# Altium footprint library Selex_PCBLib.PcbLib: 388 footprints (part 7 of 25)
Each footprint in its own frame and in the unit in brackets; x right, y up, seen from the top. Pads: shape width x height; smd on the part's side, far side on the other; paste and mask are expansions set on the pad; w line width, h text height; cw(c..) or ccw(c..) is an arc to the next point about the centre after c.
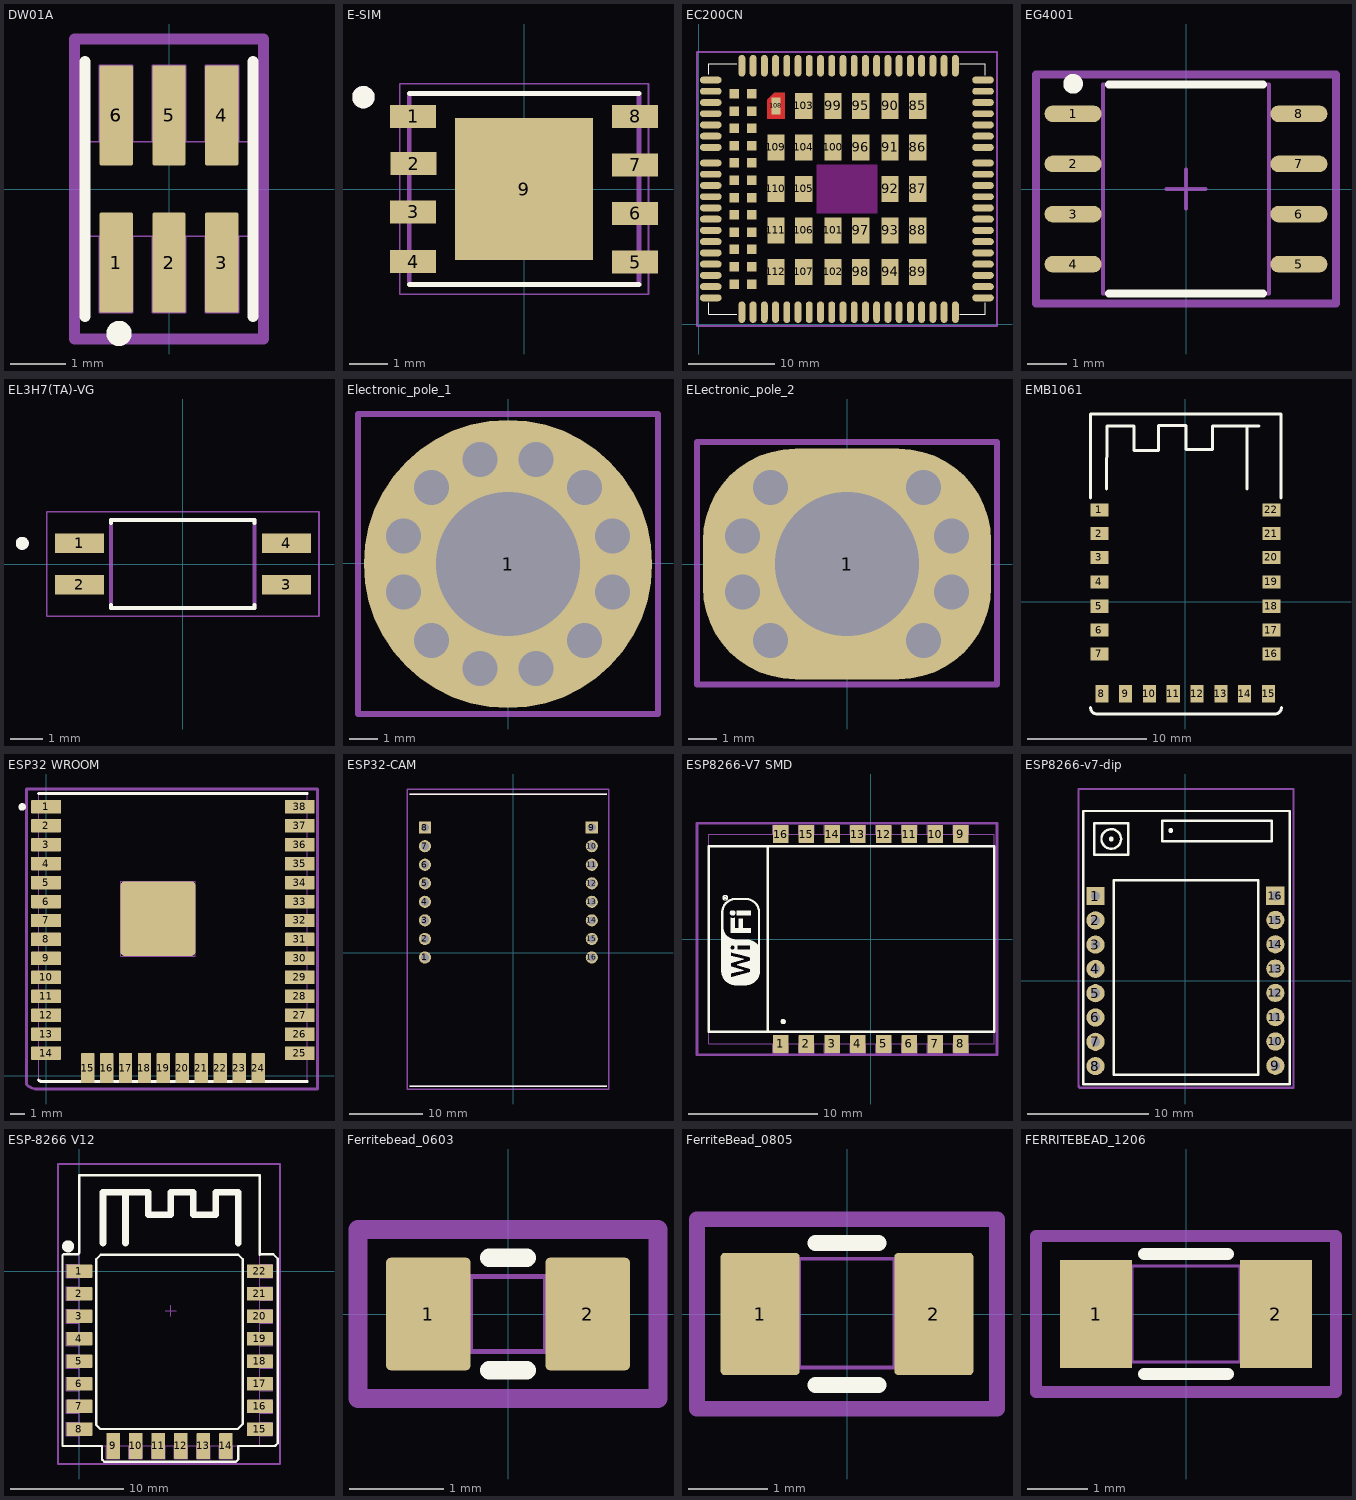
[diagram p6: the footprints below, top view; thin cyan lines are the x and y axes]

## DW01A [mm] "SOT23-6, SMD."
height 1.25
pads (7):
  rrect10% 0.6x1.8 smd mask+0.05: 1(-0.95,-1.325) 2(0,-1.325) 3(0.95,-1.325) 4(0.95,1.325) 5(0,1.325) 6(-0.95,1.325) 6(-0.95,1.325)
Top Overlay:
  circle w0.254: c-0.9,-2.6 r0.1
  lines w0.2: -1.51,-2.29 -1.51,-0.2 -1.51,0.2 -1.51,2.29 ; 1.51,-2.29 1.51,2.29 ; 1.51,-0.2 1.51,0.2
Mechanical 1:
  lines w0.03: -1.25,-2.225 -0.65,-2.225 ; -1.25,-2.225 -1.25,-0.85 ; -1.25,-2.225 -1.25,-0.85 ; -1.25,-2.225 -0.65,-2.225 ; -1.25,-0.85 -0.65,-0.85 ; -0.65,-2.225 -0.65,-0.85 ; -0.65,-2.225 -0.65,-0.85 ; 0.65,2.225 0.65,0.85 1.25,0.85 ; 0.65,2.225 1.25,2.225 ; 0.65,2.225 1.25,2.225 ; 1.25,0.85 1.25,2.225 ; 1.25,0.85 1.25,2.225 ; -1.51,-0.85 1.51,-0.85 1.51,0.85 -1.51,0.85 -1.51,-0.85 ; -1.25,0.85 -0.65,0.85 -0.65,2.225 -1.25,2.225 -1.25,0.85 ; -0.3,-2.225 -0.3,-0.85 0.3,-0.85 0.3,-2.225 -0.3,-2.225 ; -0.3,0.85 0.3,0.85 0.3,2.225 -0.3,2.225 -0.3,0.85 ; 0.65,-2.225 0.65,-0.85 1.25,-0.85 1.25,-2.225 0.65,-2.225
Mechanical 7:
  lines w0.2: -1.7,-2.7 -1.7,-0.3 -1.7,2.7 1.7,2.7 1.7,-2.7 -1.7,-2.7
3D body "User Library-SOT23-6-2.step": height 1.45, standoff 0, extent -1.45,-1.4 1.45,1.4

## E-SIM [mm]
pads (9):
  rect 1.2x0.6 smd: 1(-2.9,1.9) 2(-2.886,0.663) 3(-2.9,-0.6) 4(-2.9,-1.9) 5(2.9,-1.91) 6(2.9,-0.64) 7(2.9,0.63) 8(2.9,1.9)
  rect 3.6x3.7 smd paste-3: 9(0,0)
Top Overlay:
  circle w0.3: c-4.2,2.4 r0.141
  lines w0.127: -3,-2.5 3,-2.5 ; -3,2.5 3,2.5
Top Paste:
  region: 1.5,-1.45 0.18,-1.45 0.18,-0.18 1.5,-0.18
  region: -0.18,-1.45 -1.5,-1.45 -1.5,-0.18 -0.18,-0.18
  region: 1.5,0.18 0.18,0.18 0.18,1.45 1.5,1.45
  region: -0.18,0.18 -1.5,0.18 -1.5,1.45 -0.18,1.45
Mechanical 13:
  circle w0.3: c-4.2,2.4 r0.141
  lines w0.127: -3,-2.5 -3,2.5 3,2.5 3,-2.5 -3,-2.5
Mechanical 15:
  lines w0.05: -3.25,-2.75 -3.25,2.75 3.25,2.75 3.25,-2.75 -3.25,-2.75
3D body "SIM-ST-MFF2--3DModel-STEP-56544.STEP": height 0, standoff -0.82, extent -3,-2.5 3,2.5

## EC200CN [mm]
pads (132):
  oval 2.5x0.8 smd mask+0.05: 1(1.385,28.258) 2(1.385,26.958) 3(1.385,25.658) 4(1.385,24.358) 5(1.385,23.058) 6(1.385,21.758) 7(1.385,20.458) 8(1.385,16.058) 9(1.385,14.758) 10(1.385,13.458) 11(1.385,12.158) 12(1.385,10.858) 13(1.385,9.558) 14(1.385,8.258) 15(1.385,6.958) 16(1.385,5.658) 17(1.385,4.358) 18(1.385,3.058) 37(32.885,3.058) 38(32.885,4.358) 39(32.885,5.658) 40(32.885,6.958) 41(32.885,8.258) 42(32.885,9.558) 43(32.885,10.858) 44(32.885,12.158) 45(32.885,13.458) 46(32.885,14.758) 47(32.885,16.058) 48(32.885,20.458) 49(32.885,21.758) 50(32.885,23.058) 51(32.885,24.358) 52(32.885,25.658) 53(32.885,26.958) 54(32.885,28.258) 141(1.385,18.658) 142(1.385,17.358) 143(32.885,17.358) 144(32.885,18.658)
  oval 0.8x2.5 smd mask+0.05: 19(7.585,1.408) 20(8.885,1.408) 21(10.185,1.408) 22(11.485,1.408) 23(12.785,1.408) 24(14.085,1.408) 25(15.385,1.408) 26(16.685,1.408) 27(17.985,1.408) 28(19.285,1.408) 29(20.585,1.408) 30(21.885,1.408) 31(23.185,1.408) 32(24.485,1.408) 33(25.785,1.408) 34(27.085,1.408) 35(28.385,1.408) 36(29.685,1.408) 55(29.685,29.908) 56(28.385,29.908) 57(27.085,29.908) 58(25.785,29.908) 59(24.485,29.908) 60(23.185,29.908) 61(21.885,29.908) 62(20.585,29.908) 63(19.285,29.908) 64(17.985,29.908) 65(16.685,29.908) 66(15.385,29.908) 67(14.085,29.908) 68(12.785,29.908) 69(11.485,29.908) 70(10.185,29.908) 71(8.885,29.908) 72(7.585,29.908) 113(6.285,29.908) 114(4.985,29.908) 115(6.285,1.408) 116(4.985,1.408)
  rect 2x3 smd mask+0.05: 85(25.335,25.258) 86(25.335,20.458) 87(25.335,15.658) 88(25.335,10.858) 89(25.335,6.058) 90(22.135,25.258) 91(22.135,20.458) 92(22.135,15.658) 93(22.135,10.858) 94(22.135,6.058) 95(18.735,25.258) 96(18.735,20.458) 97(18.735,10.858) 98(18.735,6.058) 99(15.535,25.258) 100(15.535,20.458) 101(15.535,10.858) 102(15.535,6.058) 103(12.135,25.258) 104(12.135,20.458) 105(12.135,15.658) 106(12.135,10.858) 107(12.135,6.058) 109(8.935,20.458) 110(8.935,15.658) 111(8.935,10.858) 112(8.935,6.058)
  rect 1x2 smd mask+0.05: 108(8.935,25.258)
  rect 1.1x1.1 smd mask+0.05: 117(6.135,26.658) 118(6.135,24.658) 119(6.135,22.658) 120(6.135,20.658) 121(6.135,18.658) 122(6.135,16.658) 123(6.135,14.658) 124(6.135,12.658) 125(6.135,10.658) 126(6.135,8.658) 127(6.135,6.658) 128(6.135,4.658) 129(4.135,26.658) 130(4.135,24.658) 131(4.135,22.658) 132(4.135,20.658) 133(4.135,18.658) 134(4.135,16.658) 135(4.135,14.658) 136(4.135,12.658) 137(4.135,10.658) 138(4.135,8.658) 139(4.135,6.658) 140(4.135,4.658)
Top Layer:
  region: 7.935,25.958 8.735,26.758 9.935,26.758 9.935,23.758 7.935,23.758
Top Overlay:
  lines w0.102: 1.135,2.5 1.135,1.158 4.4,1.158 ; 1.135,28.9 1.135,30.158 ; 1.135,29.708 1.135,30.158 ; 1.585,30.158 1.135,30.158 ; 4.4,30.158 1.135,30.158 ; 30.2,1.158 33.135,1.158 33.135,2.5 ; 30.2,30.158 33.135,30.158 33.135,28.8
Top Paste:
  region: 7.935,25.958 8.735,26.758 9.935,26.758 9.935,23.758 7.935,23.758
Top Solder:
  region: 7.885,23.708 9.985,23.708 9.985,26.808 8.685,26.808 7.885,26.008
Keep-Out Layer:
  region: 20.635,18.458 13.635,18.458 13.635,12.858 20.635,12.858
Mechanical 15:
  lines w0.2: -0.2,-0.2 -0.2,31.5 34.5,31.5 34.5,-0.2 -0.2,-0.2
3D body "Quectel_EC200S-CN_3D_Dimensions.stp": height 2.4, standoff 0, extent 1.19,1.1 33.19,30.1

## EG4001 [mm] "TSOP, 8-Leads, Body 5.15x4.05mm, Pitch 1.27mm, IPC Medium Density"
height 0.2
pads (8):
  oval 1.45x0.42 smd: 1(-2.86,1.905) 2(-2.86,0.635) 3(-2.86,-0.635) 4(-2.86,-1.905) 5(2.86,-1.905) 6(2.86,-0.635) 7(2.86,0.635) 8(2.86,1.905)
Top Overlay:
  circle w0.25: c-2.86,2.665 r0.125
  lines w0.2: -1.95,-2.65 1.95,-2.65 ; -1.95,2.65 1.95,2.65
Mechanical 13:
  lines w0.1: -2.1,-2.65 2.1,-2.65 2.1,2.65 -2.1,2.65 -2.1,-2.65
Mechanical 15:
  lines w0.1: -0.5,0 0.5,0 ; 0,-0.5 0,0.5
  lines w0.2: -3.8,-2.9 3.8,-2.9 3.8,2.9 -3.8,2.9 -3.8,-2.9
3D body: height 0.2, standoff 0.15, extent -2.1,-2.65 2.1,2.65

## EL3H7(TA)-VG [mm]
pads (4):
  rect 1.5x0.6 smd: 1(-3.175,0.635) 2(-3.175,-0.635) 3(3.175,-0.635) 4(3.175,0.635)
Top Overlay:
  circle w0.2: c-4.925,0.635 r0.1
  lines w0.127: -2.2,-1.255 -2.2,-1.35 2.2,-1.35 2.2,-1.255 ; -2.2,1.255 -2.2,1.35 2.2,1.35 2.2,1.255
Mechanical 13:
  circle w0.2: c-4.925,0.635 r0.1
  lines w0.127: -2.2,-1.35 -2.2,1.35 2.2,1.35 2.2,-1.35 -2.2,-1.35
Mechanical 15:
  lines w0.05: -4.175,-1.6 -4.175,1.6 4.175,1.6 4.175,-1.6 -4.175,-1.6
3D body "SOIC__TA_-VG.step": height 2.01, standoff 0, extent -3.645,-1.448 3.645,1.448

## Electronic_pole_1 [mm]
pads (1):
  round 10 hole 5: 1(0,-0.025)
via -0.97,3.597 diameter 1.4 hole 1.2
via -2.652,2.626 diameter 1.4 hole 1.2
via -3.622,0.945 diameter 1.4 hole 1.2
via -3.622,-0.996 diameter 1.4 hole 1.2
via -2.652,-2.677 diameter 1.4 hole 1.2
via -0.97,-3.648 diameter 1.4 hole 1.2
via 0.97,-3.648 diameter 1.4 hole 1.2
via 2.652,-2.677 diameter 1.4 hole 1.2
via 3.622,-0.996 diameter 1.4 hole 1.2
via 3.622,0.945 diameter 1.4 hole 1.2
via 2.652,2.626 diameter 1.4 hole 1.2
via 0.97,3.597 diameter 1.4 hole 1.2
Top Overlay:
  circle w0.1: c0,-0.025 r3.75
Mechanical 15:
  lines w0.2: -5.2,-5.225 -5.2,5.175 0,5.175 5.2,5.175 5.2,-5.225 -5.2,-5.225
3D body "cocdongbe.x_t": height 28, standoff 0, extent -3.475,-3.505 3.525,3.495

## ELectronic_pole_2 [mm]
pads (1):
  rrect80% 10x8 hole 5: 1(0,0)
via -3.622,0.97 diameter 1.4 hole 1.2
via -2.652,2.652 diameter 1.4 hole 1.2
via -3.622,-0.97 diameter 1.4 hole 1.2
via -2.652,-2.652 diameter 1.4 hole 1.2
via 2.652,-2.652 diameter 1.4 hole 1.2
via 3.622,-0.97 diameter 1.4 hole 1.2
via 3.622,0.97 diameter 1.4 hole 1.2
via 2.652,2.652 diameter 1.4 hole 1.2
Top Overlay:
  circle w0.1: c0,0 r3.75
Mechanical 15:
  lines w0.2: -5.2,-4.175 5.2,-4.175 5.2,4.225 -0.975,4.225 -5.2,4.225 -5.2,-4.175
3D body "cocdongbe.x_t": height 28, standoff 0, extent -3.475,-3.48 3.525,3.52

## EMB1061 [mm]
pads (22):
  rect 1.5x1.1 smd: 1(-7.225,7.725) 2(-7.225,5.725) 3(-7.225,3.725) 4(-7.225,1.675) 5(-7.225,-0.375) 6(-7.225,-2.375) 7(-7.225,-4.375) 16(7.225,-4.375) 17(7.225,-2.375) 18(7.225,-0.375) 19(7.225,1.675) 20(7.225,3.725) 21(7.225,5.725) 22(7.225,7.725)
  rect 1.1x1.5 smd: 8(-7.025,-7.725) 9(-5.025,-7.725) 10(-3.025,-7.725) 11(-1.025,-7.725) 12(0.975,-7.725) 13(2.975,-7.725) 14(4.975,-7.725) 15(6.975,-7.725)
Top Overlay:
  lines w0.254: -7.975,-8.875 ccw(c-7.425,-8.875) -7.425,-9.425 7.503,-9.425 ccw(c7.503,-8.864) 8.064,-8.864 ; -7.975,8.725 -7.975,15.775 8.025,15.775 8.025,8.725 ; -6.621,9.475 -6.575,14.775 -4.325,14.775 -4.325,12.725 -2.275,12.725 -2.275,14.825 0.025,14.825 0.025,12.775 2.275,12.775 2.275,14.775 5.175,14.775 ; 5.175,9.475 5.175,14.775 ; 6.175,14.775 5.175,14.775

## ESP32 WROOM [mm] "ESP 32 WROOM"
height 3.2
pads (39):
  rrect10% 2x0.9 smd mask+0.05: 1(0,18.01) 2(0,16.74) 3(0,15.47) 4(0,14.2) 5(0,12.93) 6(0,11.66) 7(0,10.39) 8(0,9.12) 9(0,7.85) 10(0,6.58) 11(0,5.31) 12(0,4.04) 13(0,2.77) 14(0,1.5) 25(17,1.5) 26(17,2.77) 27(17,4.04) 28(17,5.31) 29(17,6.58) 30(17,7.85) 31(17,9.12) 32(17,10.39) 33(17,11.66) 34(17,12.93) 35(17,14.2) 36(17,15.47) 37(17,16.74) 38(17,18.01)
  rrect10% 0.9x2 smd mask+0.05: 15(2.785,0.5) 16(4.055,0.5) 17(5.325,0.5) 18(6.595,0.5) 19(7.865,0.5) 20(9.135,0.5) 21(10.405,0.5) 22(11.675,0.5) 23(12.945,0.5) 24(14.215,0.5)
  rrect10% 5x5 smd mask+0.05: ""(7.5,10.51)
Top Overlay:
  circle w0.25: c-1.6,18 r0.125
  lines w0.2: -0.5,-0.3 ccw(c-0.259,-0.059) -0.259,-0.4 17.5,-0.4 ; -0.5,18.9 17.5,18.9
Mechanical 1:
  lines w0.05: -0.5,-0.345 -0.5,18.855 17.5,18.855 17.5,-0.345 -0.5,-0.345 ; 5,8.01 5,13.01 10,13.01 10,8.01 5,8.01
Mechanical 7:
  lines w0.2: -1.3,-0.6 ccw(c-0.576,0.124) -0.576,-0.9 18.2,-0.9 18.2,19.2 -1.3,19.2 -1.3,-0.6

## ESP32-CAM [mm]
pads (16):
  round 1.665 hole 1.11: 1(-12.081,-0.677) 2(-12.081,1.863) 3(-12.081,4.403) 4(-12.081,6.943) 5(-12.081,9.483) 6(-12.081,12.023) 7(-12.081,14.563) 10(10.779,14.563) 11(10.779,12.023) 12(10.779,9.483) 13(10.779,6.943) 14(10.779,4.403) 15(10.779,1.863) 16(10.779,-0.677)
  rect 1.665x1.665 hole 1.11: 8(-12.081,17.103) 9(10.779,17.103)
Top Overlay:
  lines w0.2: -14.151,-18.317 12.849,-18.317 ; -14.151,21.683 12.849,21.683
Mechanical 13:
  lines w0.2: -14.151,-18.317 12.849,-18.317 ; -14.151,21.683 12.849,21.683
Mechanical 15:
  lines w0.2: -14.5,-18.7 -14.5,22.4 13.1,22.4 13.1,-18.7 -14.5,-18.7
3D body "ESP3-CAM v5 - black pcb.step": height 4.01, standoff -14.07, extent -14.33,-18.26 12.67,22.24

## ESP8266-V7 SMD [mm]
pads (16):
  rrect10% 1.2x1.4 smd mask+0.05: 1(-7,-8.15) 2(-5,-8.15) 3(-3,-8.15) 4(-1,-8.15) 5(1,-8.15) 6(3,-8.15) 7(5,-8.15) 8(7,-8.15) 9(7,8.15) 10(5,8.15) 11(3,8.15) 12(1,8.15) 13(-1,8.15) 14(-3,8.15) 15(-5,8.15) 16(-7,8.15)
Top Overlay:
  drawing of 1266 lines, arcs and shapes, not listed
Mechanical 1:
  lines w0.05: -12.6,8.15 -12.6,8.15 ; -12.6,8.15 9.6,8.15 ; -12.6,8.15 -12.6,-8.15 9.6,-8.15 9.6,8.15 ; -7.6,-8.85 -6.4,-8.85 ; -7.6,-8.85 -7.6,-8.15 ; -7.6,-8.85 -7.6,-8.15 ; -7.6,-8.85 -6.4,-8.85 ; -7.6,-8.15 -6.4,-8.15 ; -6.4,-8.85 -6.4,-8.15 ; -6.4,-8.85 -6.4,-8.15 ; 6.4,8.15 6.4,8.85 ; 6.4,8.15 6.4,8.85 ; 6.4,8.15 7.6,8.15 ; 6.4,8.85 7.6,8.85 ; 6.4,8.85 7.6,8.85 ; 7.6,8.15 7.6,8.85 ; 7.6,8.15 7.6,8.85 ; 7.6,8.15 9.6,8.15 ; -7.6,8.15 -6.4,8.15 -6.4,8.85 -7.6,8.85 -7.6,8.15 ; -5.6,-8.85 -5.6,-8.15 -4.4,-8.15 -4.4,-8.85 -5.6,-8.85 ; -5.6,8.15 -4.4,8.15 -4.4,8.85 -5.6,8.85 -5.6,8.15 ; -3.6,-8.85 -3.6,-8.15 -2.4,-8.15 -2.4,-8.85 -3.6,-8.85 ; -3.6,8.15 -2.4,8.15 -2.4,8.85 -3.6,8.85 -3.6,8.15 ; -1.6,-8.85 -1.6,-8.15 -0.4,-8.15 -0.4,-8.85 -1.6,-8.85 ; -1.6,8.15 -0.4,8.15 -0.4,8.85 -1.6,8.85 -1.6,8.15 ; 0.4,-8.85 0.4,-8.15 1.6,-8.15 1.6,-8.85 0.4,-8.85 ; 0.4,8.15 1.6,8.15 1.6,8.85 0.4,8.85 0.4,8.15 ; 2.4,-8.85 2.4,-8.15 3.6,-8.15 3.6,-8.85 2.4,-8.85 ; 2.4,8.15 3.6,8.15 3.6,8.85 2.4,8.85 2.4,8.15 ; 4.4,-8.85 4.4,-8.15 5.6,-8.15 5.6,-8.85 4.4,-8.85 ; 4.4,8.15 5.6,8.15 5.6,8.85 4.4,8.85 4.4,8.15 ; 6.4,-8.85 6.4,-8.15 7.6,-8.15 7.6,-8.85 6.4,-8.85
  text "16" at -7.5,5.9 h0.8
  text "9" at 6.8,6 h0.8
  text "8" at 6.8,-6.8 h0.8
  text "1" at -7.2,-6.8 h0.8
Mechanical 7:
  lines w0.2: -6.9,9 9.8,9 9.8,-9 -13.5,-9 -13.5,9 -6.7,9
3D body "User Library-ESP07-1.step": height 3.5, standoff -0.01, extent -13.313,-8.181 8.687,7.819

## ESP8266-v7-dip [mm] "dip,though"
pads (16):
  rect 1.5x1.5 hole 0.75: 1(-7.404,6.987) 16(7.404,7.013)
  round 1.5 hole 0.75: 2(-7.404,4.987) 3(-7.404,2.987) 4(-7.404,0.987) 5(-7.404,-1.013) 6(-7.404,-3.013) 7(-7.404,-5.013) 8(-7.404,-7.013) 9(7.404,-6.987) 10(7.404,-4.987) 11(7.404,-2.987) 12(7.404,-0.987) 13(7.404,1.013) 14(7.404,3.013) 15(7.404,5.013)
Top Overlay:
  circle w0.2: c-6.104,11.687 r0.806
  circle w0.2: c-6.104,11.687 r0.1
  circle w0.2: c-1.204,12.387 r0.1
  lines w0.2: -8.404,-8.513 -8.404,13.987 8.596,13.987 8.596,-8.513 -8.404,-8.513 ; -7.504,10.387 -7.504,12.987 -4.704,12.987 -4.704,10.387 -7.504,10.387 ; -5.904,-7.713 5.996,-7.713 5.996,8.287 -5.904,8.287 -5.904,-7.713 ; -1.904,11.487 -1.904,13.187 7.096,13.187 7.096,11.487 -1.904,11.487
Mechanical 7:
  lines w0.2: -8.8,-8.559 ccw(c-8.459,-8.559) -8.7,-8.8 8.9,-8.8 8.9,15.8 -8.8,15.8 -8.8,2.5 -8.8,-8.559
3D body "User Library-PBS2-8.STEP": height 4.5, standoff -2.95, extent -8.337,-7.998 -6.337,8.002
3D body "User Library-PBS2-8.STEP": height 4.5, standoff -2.95, extent 6.42,-8.099 8.42,7.901
3D body "User Library-ESP_12_E.STEP": height 6.75, standoff 4.54, extent -8.014,-8.366 7.986,15.635

## ESP-8266 V12 [mm]
pads (22):
  rrect10% 2.3x1.2 smd mask+0.05: 1(0,0) 2(0,-2) 3(0,-4) 4(0,-6) 5(0,-8) 6(0,-10) 7(0,-12) 8(0,-14) 15(16,-14) 16(16,-12) 17(16,-10) 18(16,-8) 19(16,-6) 20(16,-4) 21(16,-2) 22(16,0)
  rrect10% 1.2x2.3 smd mask+0.05: 9(3,-15.5) 10(5,-15.5) 11(7,-15.5) 12(9,-15.5) 13(11,-15.5) 14(13,-15.5)
Top Overlay:
  circle w0.5: c-1,2.2 r0.283
  lines w0.2: 2,1.45 1.9,1.45 ; 1.9,1.45 14.1,1.45 14.5,1.05 14.5,-13.55 14.05,-14 1.85,-14 1.5,-13.65 1.5,1.05 1.9,1.45 ; -1.5,-15.5 0,-15.5 2,-15.5 2,-16.7 2.2,-16.9 13.9,-16.9 14.1,-16.7 14.1,-15.5 16,-15.5 17.35,-15.5 17.6,-15.25 17.6,-15.2 17.6,1.1 17.2,1.5 16.05,1.5 16,1.45 16,8.5 0,8.5 0,1.6 -0.1,1.5 -1.4,1.5 -1.5,1.4 -1.5,0.7 -1.5,-15.5
  lines w0.6: 2.1,2.5 2.1,7 6.1,7 6.1,5 8.1,5 8.1,7 10.1,7 10.1,5 12.1,5 12.1,7 14.1,7 14.1,2.5 ; 4.1,2.5 4.1,7
Mechanical 1:
  lines w0.05: 16,-14 16,-15.5 ; 16,-15.5 16,8.5 0,8.5 0,-14 0,-15.5 16,-15.5 ; -1.15,-14.6 -1.15,-13.4 0,-13.4 0,-14.6 -1.15,-14.6 ; -1.15,-12.6 -1.15,-11.4 0,-11.4 0,-12.6 -1.15,-12.6 ; -1.15,-10.6 -1.15,-9.4 0,-9.4 0,-10.6 -1.15,-10.6 ; -1.15,-8.6 -1.15,-7.4 0,-7.4 0,-8.6 -1.15,-8.6 ; -1.15,-6.6 -1.15,-5.4 0,-5.4 0,-6.6 -1.15,-6.6 ; -1.15,-4.6 -1.15,-3.4 0,-3.4 0,-4.6 -1.15,-4.6 ; -1.15,-2.6 -1.15,-1.4 0,-1.4 0,-2.6 -1.15,-2.6 ; -1.15,-0.6 0,-0.6 0,0.6 -1.15,0.6 -1.15,-0.6 ; 2.4,-16.65 3.6,-16.65 3.6,-15.5 2.4,-15.5 2.4,-16.65 ; 4.4,-16.65 5.6,-16.65 5.6,-15.5 4.4,-15.5 4.4,-16.65 ; 6.4,-16.65 7.6,-16.65 7.6,-15.5 6.4,-15.5 6.4,-16.65 ; 8.4,-16.65 9.6,-16.65 9.6,-15.5 8.4,-15.5 8.4,-16.65 ; 10.4,-16.65 11.6,-16.65 11.6,-15.5 10.4,-15.5 10.4,-16.65 ; 12.4,-16.65 13.6,-16.65 13.6,-15.5 12.4,-15.5 12.4,-16.65 ; 16,-14.6 16,-13.4 17.15,-13.4 17.15,-14.6 16,-14.6 ; 16,-12.6 16,-11.4 17.15,-11.4 17.15,-12.6 16,-12.6 ; 16,-10.6 16,-9.4 17.15,-9.4 17.15,-10.6 16,-10.6 ; 16,-8.6 16,-7.4 17.15,-7.4 17.15,-8.6 16,-8.6 ; 16,-6.6 16,-5.4 17.15,-5.4 17.15,-6.6 16,-6.6 ; 16,-4.6 16,-3.4 17.15,-3.4 17.15,-4.6 16,-4.6 ; 16,-2.6 16,-1.4 17.15,-1.4 17.15,-2.6 16,-2.6 ; 16,-0.6 16,0.6 17.15,0.6 17.15,-0.6 16,-0.6
Mechanical 15:
  lines w0.1: 7.6,-3.502 8.6,-3.502 ; 8.1,-4.002 8.1,-3.002
  lines w0.2: -1.9,-17.1 -1.9,9.5 17.8,9.5 17.8,-17.1 -1.9,-17.1
3D body "User Library-ESP8266-12E.STEP": height 2.6, standoff -0.4, extent 0,-15.45 16,8.93

## Ferritebead_0603 [mm]
pads (2):
  rrect10% 0.9x1.2 smd mask+0.1: 1(-0.85,0)
  rrect10% 0.9x1.2 smd: 2(0.85,0)
Top Overlay:
  lines w0.2: -0.2,-0.6 0.2,-0.6 ; -0.2,0.6 0.2,0.6
Mechanical 1:
  lines w0.05: -0.4,-0.4 -0.4,0.4 ; 0.4,-0.4 0.4,0.4 ; -0.8,-0.4 -0.8,0.4 0.8,0.4 0.8,-0.4 -0.8,-0.4
Mechanical 15:
  lines w0.2: -1.6,-0.9 -1.6,0.9 1.6,0.9 1.6,-0.9 -1.6,-0.9
3D body "L0603C22NJRMST.STEP": height 0.9, standoff 0.1, extent -0.8,-0.55 0.8,0.4

## FerriteBead_0805 [mm]
pads (2):
  rrect10% 1x1.55 smd mask+0.1: 1(-1.1,0) 2(1.1,0)
Top Overlay:
  lines w0.2: -0.4,-0.9 0.4,-0.9 ; -0.4,0.9 0.4,0.9
Mechanical 1:
  lines w0.05: -0.61,-0.675 -0.61,0.675 ; 0.6,-0.66 0.6,0.675 ; -1.1,-0.675 -1.1,0.7 1.1,0.7 1.1,-0.675 -1.1,-0.675
Mechanical 15:
  lines w0.2: -1.9,-1.2 -1.9,1.2 1.9,1.2 1.9,-1.2 -1.9,-1.2
3D body "CAP0805.step": height 0.73, standoff -0.03, extent -1,-0.655 1,0.655

## FERRITEBEAD_1206 [mm]
pads (2):
  rect 1.2x1.8 smd mask+0.1: 1(-1.5,0) 2(1.5,0)
Top Overlay:
  lines w0.2: -0.7,-1 0.7,-1 ; -0.7,1 0.7,1
Mechanical 1:
  lines w0.05: -0.9,-0.8 -0.9,0.8 ; 0.9,-0.8 0.9,0.8 ; -1.6,-0.8 1.6,-0.8 1.6,0.8 -1.6,0.8 -1.6,-0.8
Mechanical 15:
  lines w0.2: -2.5,-1.3 -2.5,1.3 2.5,1.3 2.5,-1.3 -2.5,-1.3
3D body "CAP1206.step": height 1.53, standoff -0.03, extent -1.6,-0.83 1.6,0.83